# Altium schematic symbol library Diodes - TVS.SchLib: 5379 symbols (part 5 of 35) (continued)
## 824541331 (continued)
TVS DIODE 33V 53.3V DO214AB; Manufacturer: Würth Elektronik; Bidirectional Channels: 1; Current - Peak Pulse (10/1000µs): 28.2A; Power Line Protection: No; Power - Peak Pulse: 1500W (1.5kW); Type: Zener; Voltage - Breakdown (Min): 38.65V (Typ); Voltage - Reverse Standoff (Typ): 33V (Max); Part Number: 824541331; Applications: General Purpose; ComponentLink1Description: Datasheet; ComponentLink1URL: https://katalog.we-online.de/pbs/datasheet/824541331.pdf; ComponentLink2Description: DigiKey Link; ComponentLink2URL: http://digikey.com/product-detail/en/w-rth-elektronik/824541331/732-9819-1-ND/5870973; LastUpdated: 9/2/2020 1:28:05 AM; Lifecycle Status: Active; Minimum Order: 0; Mounting Type: Surface Mount; Operating Temperature: -65°C ~ 150°C (TJ); Package / Case: DO-214AB, SMC; Packaging: TapeAndReel; PartId: 8278; Part Status: Active; Price: 0.60; Series: WE-TVSP; Supplier 1: DigiKey; Supplier Part Number 1: 732-9819-1-ND; Supplier Device Package: DO-214AB; Voltage - Clamping (Max) @ Ipp: 53.3V
footprint DO214AB SMC
pins: 1, 2

## 824541442
designator D?
WE-TVSP POWER TVS DIODE; Manufacturer: Würth Elektronik; Bidirectional Channels: 1; Current - Peak Pulse (10/1000µs): 2.1A; Power Line Protection: No; Type: Zener; Voltage - Breakdown (Min): 517.5V; Voltage - Clamping (Max) @ Ipp: 713V; Voltage - Reverse Standoff (Typ): 440V (Max); Part Number: 824541442; Applications: General Purpose; ComponentLink2Description: DigiKey Link; ComponentLink2URL: http://digikey.com/product-detail/en/würth-elektronik/824541442/732-824541442CT-ND/12727221; LastUpdated: 8/30/2020 9:07:32 PM; Lifecycle Status: Active; Minimum Order: 1; Mounting Type: Surface Mount; Package / Case: DO-214AB, SMC; Packaging: TapeAndReel; PartId: 11481; Price: 1.35; Series: WE-TVSP; Supplier 1: DigiKey; Supplier Part Number 1: 732-824541442CT-ND; Supplier Device Package: DO-214AB
footprint DO214AB SMC
pins: 1, 2

## 824550241
designator D?
TVS DIODE 24V 38.9V DO214AB; Manufacturer: Würth Elektronik; Current - Peak Pulse (10/1000µs): 77.1A; Power Line Protection: No; Power - Peak Pulse: 3000W (3kW); Type: Zener; Unidirectional Channels: 1; Voltage - Breakdown (Min): 28.1V (Typ); Voltage - Reverse Standoff (Typ): 24V (Max); Part Number: 824550241; Applications: General Purpose; ComponentLink1Description: Datasheet; ComponentLink1URL: https://katalog.we-online.de/pbs/datasheet/824550241.pdf; ComponentLink2Description: DigiKey Link; ComponentLink2URL: http://digikey.com/product-detail/en/w-rth-elektronik/824550241/732-9921-1-ND/5871075; LastUpdated: 9/2/2020 1:19:58 AM; Lifecycle Status: Active; Minimum Order: 1; Mounting Type: Surface Mount; Operating Temperature: -65°C ~ 150°C (TJ); Package / Case: DO-214AB, SMC; Packaging: TapeAndReel; PartId: 6238; Part Status: Active; Price: 1.17; Series: WE-TVSP; Supplier 1: DigiKey; Supplier Part Number 1: 732-9921-1-ND; Supplier Device Package: DO-214AB; Voltage - Clamping (Max) @ Ipp: 38.9V
footprint DO214AB SMC
pins: 1, 2

## 824550281
designator D?
TVS DIODE 28V 45.4V DO214AB; Manufacturer: Würth Elektronik; Current - Peak Pulse (10/1000µs): 66.1A; Power Line Protection: No; Power - Peak Pulse: 3000W (3kW); Type: Zener; Unidirectional Channels: 1; Voltage - Breakdown (Min): 32.75V (Typ); Voltage - Reverse Standoff (Typ): 28V (Max); Part Number: 824550281; Applications: General Purpose; ComponentLink1Description: Datasheet; ComponentLink1URL: https://katalog.we-online.de/pbs/datasheet/824550281.pdf; ComponentLink2Description: DigiKey Link; ComponentLink2URL: http://digikey.com/product-detail/en/w-rth-elektronik/824550281/732-9918-1-ND/5871072; LastUpdated: 9/2/2020 1:19:58 AM; Lifecycle Status: Active; Minimum Order: 1; Mounting Type: Surface Mount; Operating Temperature: -65°C ~ 150°C (TJ); Package / Case: DO-214AB, SMC; Packaging: TapeAndReel; PartId: 6237; Part Status: Active; Price: 1.17; Series: WE-TVSP; Supplier 1: DigiKey; Supplier Part Number 1: 732-9918-1-ND; Supplier Device Package: DO-214AB; Voltage - Clamping (Max) @ Ipp: 45.4V
footprint DO214AB SMC
pins: 1, 2

## 824550331
designator D?
TVS DIODE 33V 53.3V DO214AB; Manufacturer: Würth Elektronik; Current - Peak Pulse (10/1000µs): 56.3A; Power Line Protection: No; Power - Peak Pulse: 3000W (3kW); Type: Zener; Unidirectional Channels: 1; Voltage - Breakdown (Min): 38.65V (Typ); Voltage - Reverse Standoff (Typ): 33V (Max); Part Number: 824550331; Applications: General Purpose; ComponentLink1Description: Datasheet; ComponentLink1URL: https://katalog.we-online.de/pbs/datasheet/824550331.pdf; ComponentLink2Description: DigiKey Link; ComponentLink2URL: http://digikey.com/product-detail/en/w-rth-elektronik/824550331/732-9923-1-ND/5871077; LastUpdated: 9/2/2020 1:19:58 AM; Lifecycle Status: Active; Minimum Order: 1; Mounting Type: Surface Mount; Operating Temperature: -65°C ~ 150°C (TJ); Package / Case: DO-214AB, SMC; Packaging: TapeAndReel; PartId: 6236; Part Status: Active; Price: 1.17; Series: WE-TVSP; Supplier 1: DigiKey; Supplier Part Number 1: 732-9923-1-ND; Supplier Device Package: DO-214AB; Voltage - Clamping (Max) @ Ipp: 53.3V
footprint DO214AB SMC
pins: 1, 2

## 824550581
designator D?
TVS DIODE 58V 93.6V DO214AB; Manufacturer: Würth Elektronik; Current - Peak Pulse (10/1000µs): 32.1A; Power Line Protection: No; Power - Peak Pulse: 3000W (3kW); Type: Zener; Unidirectional Channels: 1; Voltage - Breakdown (Min): 67.8V (Typ); Voltage - Reverse Standoff (Typ): 58V (Max); Part Number: 824550581; Applications: General Purpose; ComponentLink1Description: Datasheet; ComponentLink1URL: https://katalog.we-online.de/pbs/datasheet/824550581.pdf; ComponentLink2Description: DigiKey Link; ComponentLink2URL: http://digikey.com/product-detail/en/w-rth-elektronik/824550581/732-9930-1-ND/5871084; LastUpdated: 9/2/2020 1:20:00 AM; Lifecycle Status: Active; Minimum Order: 1; Mounting Type: Surface Mount; Operating Temperature: -65°C ~ 150°C (TJ); Package / Case: DO-214AB, SMC; Packaging: TapeAndReel; PartId: 6429; Part Status: Active; Price: 1.17; Series: WE-TVSP; Supplier 1: DigiKey; Supplier Part Number 1: 732-9930-1-ND; Supplier Device Package: DO-214AB; Voltage - Clamping (Max) @ Ipp: 93.6V
footprint DO214AB SMC
pins: 1, 2

## 824551102
designator D?
TVS DIODE 100V 162V DO214AB; Manufacturer: Würth Elektronik; Bidirectional Channels: 1; Current - Peak Pulse (10/1000µs): 18.5A; Power Line Protection: No; Power - Peak Pulse: 3000W (3kW); Type: Zener; Voltage - Breakdown (Min): 117V (Typ); Voltage - Reverse Standoff (Typ): 100V (Max); Part Number: 824551102; Applications: General Purpose; ComponentLink1Description: Datasheet; ComponentLink1URL: https://katalog.we-online.de/pbs/datasheet/824551102.pdf; ComponentLink2Description: DigiKey Link; ComponentLink2URL: http://digikey.com/product-detail/en/w-rth-elektronik/824551102/732-9903-1-ND/5871057; LastUpdated: 9/2/2020 1:28:01 AM; Lifecycle Status: Active; Minimum Order: 1; Mounting Type: Surface Mount; Operating Temperature: -65°C ~ 150°C (TJ); Package / Case: DO-214AB, SMC; Packaging: TapeAndReel; PartId: 7898; Part Status: Active; Price: 1.17; Series: WE-TVSP; Supplier 1: DigiKey; Supplier Part Number 1: 732-9903-1-ND; Supplier Device Package: DO-214AB; Voltage - Clamping (Max) @ Ipp: 162V
footprint DO214AB SMC
pins: 1, 2

## 824551121
designator D?
TVS DIODE 12V 19.9V DO214AB; Manufacturer: Würth Elektronik; Bidirectional Channels: 1; Current - Peak Pulse (10/1000µs): 150.8A; Power Line Protection: No; Power - Peak Pulse: 3000W (3kW); Type: Zener; Voltage - Breakdown (Min): 14V (Typ); Voltage - Reverse Standoff (Typ): 12V (Max); Part Number: 824551121; Applications: General Purpose; ComponentLink1Description: Datasheet; ComponentLink1URL: https://katalog.we-online.de/pbs/datasheet/824551121.pdf; ComponentLink2Description: DigiKey Link; ComponentLink2URL: http://digikey.com/product-detail/en/w-rth-elektronik/824551121/732-9879-1-ND/5871033; LastUpdated: 9/2/2020 1:28:01 AM; Lifecycle Status: Active; Minimum Order: 1; Mounting Type: Surface Mount; Operating Temperature: -65°C ~ 150°C (TJ); Package / Case: DO-214AB, SMC; Packaging: TapeAndReel; PartId: 7896; Part Status: Active; Price: 1.17; Series: WE-TVSP; Supplier 1: DigiKey; Supplier Part Number 1: 732-9879-1-ND; Supplier Device Package: DO-214AB; Voltage - Clamping (Max) @ Ipp: 19.9V
footprint DO214AB SMC
pins: 1, 2

## 824551162
designator D?
WE-TVSP POWER TVS DIODE; Manufacturer: Würth Elektronik; Bidirectional Channels: 1; Current - Peak Pulse (10/1000µs): 11.6A; Power Line Protection: No; Type: Zener; Voltage - Breakdown (Min): 187.5V; Voltage - Clamping (Max) @ Ipp: 259V; Voltage - Reverse Standoff (Typ): 160V (Max); Part Number: 824551162; Applications: General Purpose; ComponentLink2Description: DigiKey Link; ComponentLink2URL: http://digikey.com/product-detail/en/würth-elektronik/824551162/732-824551162CT-ND/12726826; LastUpdated: 8/30/2020 9:07:32 PM; Lifecycle Status: Active; Minimum Order: 1; Mounting Type: Surface Mount; Package / Case: DO-214AB, SMC; Packaging: CutTape; PartId: 11476; Price: 1.70; Series: WE-TVSP; Supplier 1: DigiKey; Supplier Part Number 1: 732-824551162CT-ND; Supplier Device Package: DO-214AB
footprint DO214AB SMC
pins: 1, 2

## 824551202
designator D?
WE-TVSP POWER TVS DIODE; Manufacturer: Würth Elektronik; Bidirectional Channels: 1; Current - Peak Pulse (10/1000µs): 9.3A; Power Line Protection: No; Type: Zener; Voltage - Breakdown (Min): 235.5V; Voltage - Clamping (Max) @ Ipp: 324V; Voltage - Reverse Standoff (Typ): 200V (Max); Part Number: 824551202; Applications: General Purpose; ComponentLink2Description: DigiKey Link; ComponentLink2URL: http://digikey.com/product-detail/en/würth-elektronik/824551202/732-824551202CT-ND/12727780; LastUpdated: 8/30/2020 9:07:32 PM; Lifecycle Status: Active; Minimum Order: 1; Mounting Type: Surface Mount; Package / Case: DO-214AB, SMC; Packaging: TapeAndReel; PartId: 11480; Price: 1.36; Series: WE-TVSP; Supplier 1: DigiKey; Supplier Part Number 1: 732-824551202CT-ND; Supplier Device Package: DO-214AB
footprint DO214AB SMC
pins: 1, 2

## 824551222
designator D?
WE-TVSP POWER TVS DIODE; Manufacturer: Würth Elektronik; Bidirectional Channels: 1; Current - Peak Pulse (10/1000µs): 8.4A; Power Line Protection: No; Type: Zener; Voltage - Breakdown (Min): 259V; Voltage - Clamping (Max) @ Ipp: 356V; Voltage - Reverse Standoff (Typ): 220V (Max); Part Number: 824551222; Applications: General Purpose; ComponentLink2Description: DigiKey Link; ComponentLink2URL: http://digikey.com/product-detail/en/würth-elektronik/824551222/732-824551222CT-ND/12726876; LastUpdated: 8/30/2020 9:07:32 PM; Lifecycle Status: Active; Minimum Order: 1; Mounting Type: Surface Mount; Package / Case: DO-214AB, SMC; Packaging: TapeAndReel; PartId: 11479; Price: 1.39; Series: WE-TVSP; Supplier 1: DigiKey; Supplier Part Number 1: 732-824551222CT-ND; Supplier Device Package: DO-214AB
footprint DO214AB SMC
pins: 1, 2

## 824551241
designator D?
TVS DIODE 24V 38.9V DO214AB; Manufacturer: Würth Elektronik; Bidirectional Channels: 1; Current - Peak Pulse (10/1000µs): 77.1A; Power Line Protection: No; Power - Peak Pulse: 3000W (3kW); Type: Zener; Voltage - Breakdown (Min): 28.1V (Typ); Voltage - Reverse Standoff (Typ): 24V (Max); Part Number: 824551241; Applications: General Purpose; ComponentLink1Description: Datasheet; ComponentLink1URL: https://katalog.we-online.de/pbs/datasheet/824551241.pdf; ComponentLink2Description: DigiKey Link; ComponentLink2URL: http://digikey.com/product-detail/en/w-rth-elektronik/824551241/732-9886-1-ND/5871040; LastUpdated: 9/2/2020 1:28:01 AM; Lifecycle Status: Active; Minimum Order: 1; Mounting Type: Surface Mount; Operating Temperature: -65°C ~ 150°C (TJ); Package / Case: DO-214AB, SMC; Packaging: TapeAndReel; PartId: 7895; Part Status: Active; Price: 1.17; Series: WE-TVSP; Supplier 1: DigiKey; Supplier Part Number 1: 732-9886-1-ND; Supplier Device Package: DO-214AB; Voltage - Clamping (Max) @ Ipp: 38.9V
footprint DO214AB SMC
pins: 1, 2

## 824551261
designator D?
TVS DIODE 26V 42.1V DO214AB; Manufacturer: Würth Elektronik; Bidirectional Channels: 1; Current - Peak Pulse (10/1000µs): 71.3A; Power Line Protection: No; Power - Peak Pulse: 3000W (3kW); Type: Zener; Voltage - Breakdown (Min): 30.4V (Typ); Voltage - Reverse Standoff (Typ): 26V (Max); Part Number: 824551261; Applications: General Purpose; ComponentLink1Description: Datasheet; ComponentLink1URL: https://katalog.we-online.de/pbs/datasheet/824551261.pdf; ComponentLink2Description: DigiKey Link; ComponentLink2URL: http://digikey.com/product-detail/en/w-rth-elektronik/824551261/732-9882-1-ND/5871036; LastUpdated: 9/2/2020 1:28:06 AM; Lifecycle Status: Active; Minimum Order: 0; Mounting Type: Surface Mount; Operating Temperature: -65°C ~ 150°C (TJ); Package / Case: DO-214AB, SMC; Packaging: TapeAndReel; PartId: 8490; Part Status: Active; Price: 1.17; Series: WE-TVSP; Supplier 1: DigiKey; Supplier Part Number 1: 732-9882-1-ND; Supplier Device Package: DO-214AB; Voltage - Clamping (Max) @ Ipp: 42.1V
footprint DO214AB SMC
pins: 1, 2

## 824551281
designator D?
TVS DIODE 28V 45.4V DO214AB; Manufacturer: Würth Elektronik; Bidirectional Channels: 1; Current - Peak Pulse (10/1000µs): 66.1A; Power Line Protection: No; Power - Peak Pulse: 3000W (3kW); Type: Zener; Voltage - Breakdown (Min): 32.75V (Typ); Voltage - Reverse Standoff (Typ): 28V (Max); Part Number: 824551281; Applications: General Purpose; ComponentLink1Description: Datasheet; ComponentLink1URL: https://katalog.we-online.de/pbs/datasheet/824551281.pdf; ComponentLink2Description: DigiKey Link; ComponentLink2URL: http://digikey.com/product-detail/en/w-rth-elektronik/824551281/732-9883-1-ND/5871037; LastUpdated: 9/2/2020 1:28:01 AM; Lifecycle Status: Active; Minimum Order: 0; Mounting Type: Surface Mount; Operating Temperature: -65°C ~ 150°C (TJ); Package / Case: DO-214AB, SMC; Packaging: TapeAndReel; PartId: 7900; Part Status: Active; Price: 1.17; Series: WE-TVSP; Supplier 1: DigiKey; Supplier Part Number 1: 732-9883-1-ND; Supplier Device Package: DO-214AB; Voltage - Clamping (Max) @ Ipp: 45.4V
footprint DO214AB SMC
pins: 1, 2

## 824551301
designator D?
TVS DIODE 30V 48.4V DO214AB; Manufacturer: Würth Elektronik; Bidirectional Channels: 1; Current - Peak Pulse (10/1000µs): 62A; Power Line Protection: No; Power - Peak Pulse: 3000W (3kW); Type: Zener; Voltage - Breakdown (Min): 35.05V (Typ); Voltage - Reverse Standoff (Typ): 30V (Max); Part Number: 824551301; Applications: General Purpose; ComponentLink1Description: Datasheet; ComponentLink1URL: https://katalog.we-online.de/pbs/datasheet/824551301.pdf; ComponentLink2Description: DigiKey Link; ComponentLink2URL: http://digikey.com/product-detail/en/w-rth-elektronik/824551301/732-9888-1-ND/5871042; LastUpdated: 9/2/2020 1:28:01 AM; Lifecycle Status: Active; Minimum Order: 0; Mounting Type: Surface Mount; Operating Temperature: -65°C ~ 150°C (TJ); Package / Case: DO-214AB, SMC; Packaging: TapeAndReel; PartId: 7899; Part Status: Active; Price: 1.17; Series: WE-TVSP; Supplier 1: DigiKey; Supplier Part Number 1: 732-9888-1-ND; Supplier Device Package: DO-214AB; Voltage - Clamping (Max) @ Ipp: 48.4V
footprint DO214AB SMC
pins: 1, 2

## 824551331
designator D?
TVS DIODE 33V 53.3V DO214AB; Manufacturer: Würth Elektronik; Bidirectional Channels: 1; Current - Peak Pulse (10/1000µs): 56.3A; Power Line Protection: No; Power - Peak Pulse: 3000W (3kW); Type: Zener; Voltage - Breakdown (Min): 38.65V (Typ); Voltage - Reverse Standoff (Typ): 33V (Max); Part Number: 824551331; Applications: General Purpose; ComponentLink1Description: Datasheet; ComponentLink1URL: https://katalog.we-online.de/pbs/datasheet/824551331.pdf; ComponentLink2Description: DigiKey Link; ComponentLink2URL: http://digikey.com/product-detail/en/w-rth-elektronik/824551331/732-9889-1-ND/5871043; LastUpdated: 9/2/2020 1:28:01 AM; Lifecycle Status: Active; Minimum Order: 1; Mounting Type: Surface Mount; Operating Temperature: -65°C ~ 150°C (TJ); Package / Case: DO-214AB, SMC; Packaging: TapeAndReel; PartId: 7897; Part Status: Active; Price: 1.17; Series: WE-TVSP; Supplier 1: DigiKey; Supplier Part Number 1: 732-9889-1-ND; Supplier Device Package: DO-214AB; Voltage - Clamping (Max) @ Ipp: 53.3V
footprint DO214AB SMC
pins: 1, 2

## 824551361
designator D?
TVS DIODE 36V 58.1V DO214AB; Manufacturer: Würth Elektronik; Bidirectional Channels: 1; Current - Peak Pulse (10/1000µs): 51.6A; Power Line Protection: No; Power - Peak Pulse: 3000W (3kW); Type: Zener; Voltage - Breakdown (Min): 42.1V (Typ); Voltage - Reverse Standoff (Typ): 36V (Max); Part Number: 824551361; Applications: General Purpose; ComponentLink1Description: Datasheet; ComponentLink1URL: https://katalog.we-online.de/pbs/datasheet/824551361.pdf; ComponentLink2Description: DigiKey Link; ComponentLink2URL: http://digikey.com/product-detail/en/w-rth-elektronik/824551361/732-9887-1-ND/5871041; LastUpdated: 9/2/2020 1:28:06 AM; Lifecycle Status: Active; Minimum Order: 1; Mounting Type: Surface Mount; Operating Temperature: -65°C ~ 150°C (TJ); Package / Case: DO-214AB, SMC; Packaging: TapeAndReel; PartId: 8486; Part Status: Active; Price: 1.17; Series: WE-TVSP; Supplier 1: DigiKey; Supplier Part Number 1: 732-9887-1-ND; Supplier Device Package: DO-214AB; Voltage - Clamping (Max) @ Ipp: 58.1V
footprint DO214AB SMC
pins: 1, 2

## ACPDQC3V3R-HF
designator D?
ESD DIODE 3.3VWM 18VC 0402 SOD-9; Manufacturer: Comchip Technology; Bidirectional Channels: 1; Capacitance @ Frequency: 18pF @ 1MHz; Current - Peak Pulse (10/1000µs): 2A (8/20µs); Power Line Protection: No; Power - Peak Pulse: 36W; Type: Zener; Voltage - Breakdown (Min): 5V; Voltage - Clamping (Max) @ Ipp: 18V; Voltage - Reverse Standoff (Typ): 3.3V (Max); Part Number: ACPDQC3V3R-HF; Applications: Automotive; ComponentLink1Description: Datasheet; ComponentLink1URL: http://www.comchiptech.com/admin/files/product/12025_20190315100524.pdf; ComponentLink2Description: DigiKey Link; ComponentLink2URL: http://digikey.com/product-detail/en/comchip-technology/ACPDQC3V3R-HF/641-2045-1-ND/10106896; Device Package: 0402 (1006 Metric); LastUpdated: 9/2/2020 1:28:49 AM; Lifecycle Status: Active; Minimum Order: 1; Mounting Type: Surface Mount; Operating Temperature: -55°C ~ 150°C (TJ); Package / Case: 0402 (1006 Metric); Packaging: TapeAndReel; PartId: 10484; Part Status: Active; Price: 0.05; Series: Automotive, AEC-Q101; Supplier 1: DigiKey; Supplier Part Number 1: 641-2045-1-ND; Supplier Device Package: 0402C/SOD-923F
footprint 0402
pins: 1, 2

## ACPDQC3V3T-HF
designator D?
TVS DIODE 3.3V 9.8V 0402C; Manufacturer: Comchip Technology; Bidirectional Channels: 1; Capacitance @ Frequency: 20pF @ 1MHz; Current - Peak Pulse (10/1000µs): 16A (8/20µs); Power Line Protection: No; Type: Zener; Voltage - Breakdown (Min): 3.6V; Voltage - Reverse Standoff (Typ): 3.3V (Max); Part Number: ACPDQC3V3T-HF; Applications: Automotive; ComponentLink1Description: Datasheet; ComponentLink1URL: http://www.comchiptech.com/admin/files/product/ACPDQC3V3T-HF%20RevA660763.pdf; ComponentLink2Description: DigiKey Link; ComponentLink2URL: http://digikey.com/product-detail/en/comchip-technology/ACPDQC3V3T-HF/641-1635-1-ND/5013840; Device Package: 0402 (1005 Metric); LastUpdated: 9/2/2020 1:28:49 AM; Lifecycle Status: Active; Minimum Order: 1; Mounting Type: Surface Mount; Package / Case: 0402 (1005 Metric); Packaging: TapeAndReel; PartId: 10466; Part Status: Active; Price: 0.06; Series: Automotive, AEC-Q101; Supplier 1: DigiKey; Supplier Part Number 1: 641-1635-1-ND; Supplier Device Package: 0402C/SOD-923F; Voltage - Clamping (Max) @ Ipp: 9.8V
footprint 0402
pins: 1, 2

## ACPDQC5V0CSP-HF
designator D?
TVS DIODE 5V 20V 0402C/SOD923F; Manufacturer: Comchip Technology; Bidirectional Channels: 1; Capacitance @ Frequency: 0.3pF @ 1MHz; Current - Peak Pulse (10/1000µs): 3A (8/20µs); Power Line Protection: No; Power - Peak Pulse: 60W; Type: Zener; Voltage - Breakdown (Min): 6V; Voltage - Reverse Standoff (Typ): 5V (Max); Part Number: ACPDQC5V0CSP-HF; Applications: Automotive; ComponentLink1Description: Datasheet; ComponentLink1URL: http://www.comchiptech.com/admin/files/product/ACPDQC5V0CSP-HF%20RevA449708.pdf; ComponentLink2Description: DigiKey Link; ComponentLink2URL: http://digikey.com/product-detail/en/comchip-technology/ACPDQC5V0CSP-HF/641-1783-1-ND/6138947; Device Package: 0402 (1006 Metric); LastUpdated: 9/2/2020 1:28:49 AM; Lifecycle Status: Active; Minimum Order: 1; Mounting Type: Surface Mount; Operating Temperature: -55°C ~ 150°C (TJ); Package / Case: 0402 (1006 Metric); Packaging: TapeAndReel; PartId: 10461; Part Status: Active; Price: 0.08; Series: Automotive, AEC-Q101; Supplier 1: DigiKey; Supplier Part Number 1: 641-1783-1-ND; Supplier Device Package: 0402/SOD-923F; Voltage - Clamping (Max) @ Ipp: 20V
footprint 0402
pins: 1, 2

## ACPDQC5V0CSP-IPHF
designator D?
ESD DIODE 5VWM 19VC BI-DIR 0402; Manufacturer: Comchip Technology; Bidirectional Channels: 1; Capacitance @ Frequency: 0.15pF @ 1MHz; Current - Peak Pulse (10/1000µs): 2A (8/20µs); Power Line Protection: No; Power - Peak Pulse: 38W; Type: Zener; Voltage - Breakdown (Min): 7V; Voltage - Clamping (Max) @ Ipp: 19V; Voltage - Reverse Standoff (Typ): 5V (Max); Part Number: ACPDQC5V0CSP-IPHF; Applications: Automotive; ComponentLink1Description: Datasheet; ComponentLink1URL: http://www.comchiptech.com/admin/files/product/ACPDQC5V0CSP-IPHF%20RevA.PDF; ComponentLink2Description: DigiKey Link; ComponentLink2URL: http://digikey.com/product-detail/en/comchip-technology/ACPDQC5V0CSP-IPHF/641-2058-1-ND/10106909; Device Package: 0402 (1006 Metric); LastUpdated: 9/2/2020 1:28:49 AM; Lifecycle Status: Active; Minimum Order: 1; Mounting Type: Surface Mount; Operating Temperature: -55°C ~ 150°C (TJ); Package / Case: 0402 (1006 Metric); Packaging: TapeAndReel; PartId: 10455; Part Status: Active; Price: 0.09; Series: Automotive, AEC-Q101; Supplier 1: DigiKey; Supplier Part Number 1: 641-2058-1-ND; Supplier Device Package: 0402C/SOD-923F
footprint 0402
pins: 1, 2

## ACPDQC5V0ESPC-HF
designator D?
ESD DIODE 5VWM 25VC BI-DIR 0402; Manufacturer: Comchip Technology; Bidirectional Channels: 1; Capacitance @ Frequency: 0.28pF @ 1MHz; Current - Peak Pulse (10/1000µs): 4A (8/20µs); Power Line Protection: No; Power - Peak Pulse: 100W; Type: Zener; Voltage - Breakdown (Min): 7V; Voltage - Clamping (Max) @ Ipp: 35V (Typ); Voltage - Reverse Standoff (Typ): 5V (Max); Part Number: ACPDQC5V0ESPC-HF; Applications: Automotive; ComponentLink1Description: Datasheet; ComponentLink1URL: http://www.comchiptech.com/admin/files/product/ACPDQC5V0ESPC-HF%20RevA925610.pdf; ComponentLink2Description: DigiKey Link; ComponentLink2URL: http://digikey.com/product-detail/en/comchip-technology/ACPDQC5V0ESPC-HF/641-2059-1-ND/10106910; Device Package: 0402 (1006 Metric); LastUpdated: 9/2/2020 1:28:48 AM; Lifecycle Status: Active; Minimum Order: 1; Mounting Type: Surface Mount; Operating Temperature: -40°C ~ 125°C (TJ); Package / Case: 0402 (1006 Metric); Packaging: TapeAndReel; PartId: 10430; Part Status: Active; Price: 0.08; Series: Automotive, AEC-Q101; Supplier 1: DigiKey; Supplier Part Number 1: 641-2059-1-ND; Supplier Device Package: 0402C/SOD-923F
footprint 0402
pins: 1, 2

## ACPDQC5V0R-HF
designator D?
TVS DIODE 5V 12V 0402C/SOD923F; Manufacturer: Comchip Technology; Bidirectional Channels: 1; Capacitance @ Frequency: 24pF @ 1MHz; Current - Peak Pulse (10/1000µs): 11A (8/20µs); Power Line Protection: No; Type: Zener; Voltage - Breakdown (Min): 5.6V; Voltage - Reverse Standoff (Typ): 5V (Max); Part Number: ACPDQC5V0R-HF; Applications: Automotive; ComponentLink1Description: Datasheet; ComponentLink1URL: http://www.comchiptech.com/admin/files/product/ACPDxx5V0R-HF%20Series%20RevB661222.pdf; ComponentLink2Description: DigiKey Link; ComponentLink2URL: http://digikey.com/product-detail/en/comchip-technology/ACPDQC5V0R-HF/641-1636-1-ND/5013841; Device Package: 0402 (1005 Metric); LastUpdated: 9/2/2020 1:28:49 AM; Lifecycle Status: Active; Minimum Order: 1; Mounting Type: Surface Mount; Operating Temperature: -40°C ~ 150°C (TJ); Package / Case: 0402 (1005 Metric); Packaging: TapeAndReel; PartId: 10494; Part Status: Active; Price: 0.06; Series: Automotive, AEC-Q101; Supplier 1: DigiKey; Supplier Part Number 1: 641-1636-1-ND; Supplier Device Package: 0402C/SOD-923F; Voltage - Clamping (Max) @ Ipp: 12V
footprint 0402
pins: 1, 2

## ACPDQC5V0USP-IPHF
designator D?
ESD DIODE 5VWM 15VC 0402 SOD-923; Manufacturer: Comchip Technology; Capacitance @ Frequency: 0.3pF @ 1MHz; Current - Peak Pulse (10/1000µs): 2A (8/20µs); Power Line Protection: No; Power - Peak Pulse: 30W; Type: Zener; Unidirectional Channels: 1; Voltage - Breakdown (Min): 6V; Voltage - Clamping (Max) @ Ipp: 15V; Voltage - Reverse Standoff (Typ): 5V (Max); Part Number: ACPDQC5V0USP-IPHF; Applications: Automotive; ComponentLink1Description: Datasheet; ComponentLink1URL: http://www.comchiptech.com/admin/files/product/12015_20190312162617.PDF; ComponentLink2Description: DigiKey Link; ComponentLink2URL: http://digikey.com/product-detail/en/comchip-technology/ACPDQC5V0USP-IPHF/641-2048-1-ND/10106899; Device Package: 0402 (1006 Metric); LastUpdated: 9/2/2020 1:28:45 AM; Lifecycle Status: Active; Minimum Order: 1; Mounting Type: Surface Mount; Operating Temperature: -55°C ~ 150°C (TJ); Package / Case: 0402 (1006 Metric); Packaging: TapeAndReel; PartId: 10390; Part Status: Active; Price: 0.07; Series: Automotive, AEC-Q101; Supplier 1: DigiKey; Supplier Part Number 1: 641-2048-1-ND; Supplier Device Package: 0402C/SOD-923F
footprint 0402
pins: 1, 2

## ACPDQC12V-HF
designator D?
ESD DIODE 12VWM 25VC BI-DIR 0402; Manufacturer: Comchip Technology; Bidirectional Channels: 1; Capacitance @ Frequency: 12pF @ 1MHz; Current - Peak Pulse (10/1000µs): 1A (8/20µs); Power Line Protection: No; Power - Peak Pulse: 25W; Type: Zener; Voltage - Breakdown (Min): 13V; Voltage - Clamping (Max) @ Ipp: 25V; Voltage - Reverse Standoff (Typ): 12V (Max); Part Number: ACPDQC12V-HF; Applications: Automotive; ComponentLink1Description: Datasheet; ComponentLink1URL: http://www.comchiptech.com/admin/files/product/12027_20190315101536.pdf; ComponentLink2Description: DigiKey Link; ComponentLink2URL: http://digikey.com/product-detail/en/comchip-technology/ACPDQC12V-HF/641-2050-1-ND/10106901; Device Package: 0402 (1006 Metric); LastUpdated: 9/2/2020 1:28:49 AM; Lifecycle Status: Active; Minimum Order: 1; Mounting Type: Surface Mount; Operating Temperature: -40°C ~ 125°C (TJ); Package / Case: 0402 (1006 Metric); Packaging: TapeAndReel; PartId: 10478; Part Status: Active; Price: 0.08; Series: Automotive, AEC-Q101; Supplier 1: DigiKey; Supplier Part Number 1: 641-2050-1-ND; Supplier Device Package: 0402C/SOD-923F
footprint 0402
pins: 1, 2

## ACPDQC12VEU-HF
designator D?
ESD DIODE 12VWM 22VC 0402 SOD-92; Manufacturer: Comchip Technology; Capacitance @ Frequency: 60pF @ 1MHz (Max); Current - Peak Pulse (10/1000µs): 5A (8/20µs); Power Line Protection: No; Power - Peak Pulse: 110W; Type: Zener; Unidirectional Channels: 1; Voltage - Breakdown (Min): 13.5V; Voltage - Clamping (Max) @ Ipp: 22V; Voltage - Reverse Standoff (Typ): 12V (Max); Part Number: ACPDQC12VEU-HF; Applications: Automotive; ComponentLink1Description: Datasheet; ComponentLink1URL: http://www.comchiptech.com/admin/files/product/12014_20190312162309.PDF; ComponentLink2Description: DigiKey Link; ComponentLink2URL: http://digikey.com/product-detail/en/comchip-technology/ACPDQC12VEU-HF/641-2051-1-ND/10106902; Device Package: 0402 (1006 Metric); LastUpdated: 9/2/2020 1:28:45 AM; Lifecycle Status: Active; Minimum Order: 1; Mounting Type: Surface Mount; Operating Temperature: -55°C ~ 125°C (TJ); Package / Case: 0402 (1006 Metric); Packaging: TapeAndReel; PartId: 10371; Part Status: Active; Price: 0.04; Series: Automotive, AEC-Q101; Supplier 1: DigiKey; Supplier Part Number 1: 641-2051-1-ND; Supplier Device Package: 0402C/SOD-923F
footprint 0402
pins: 1, 2

## ACPDQC24VE-HF
designator D?
TVS DIODE 24V 44V 0402C/SOD923F; Manufacturer: Comchip Technology; Bidirectional Channels: 1; Capacitance @ Frequency: 16pF @ 1MHz; Current - Peak Pulse (10/1000µs): 2.5A (8/20µs); Power Line Protection: No; Power - Peak Pulse: 110W; Type: Zener; Voltage - Breakdown (Min): 26.5V; Voltage - Reverse Standoff (Typ): 24V (Max); Part Number: ACPDQC24VE-HF; Applications: Automotive; ComponentLink1Description: Datasheet; ComponentLink1URL: http://www.comchiptech.com/admin/files/product/ACPDQC24VE-HF%20RevA727899.pdf; ComponentLink2Description: DigiKey Link; ComponentLink2URL: http://digikey.com/product-detail/en/comchip-technology/ACPDQC24VE-HF/641-1883-1-ND/7100781; Device Package: 0402 (1006 Metric); LastUpdated: 9/2/2020 1:28:49 AM; Lifecycle Status: Active; Minimum Order: 1; Mounting Type: Surface Mount; Operating Temperature: -55°C ~ 125°C (TJ); Package / Case: 0402 (1006 Metric); Packaging: TapeAndReel; PartId: 10453; Part Status: Active; Price: 0.07; Series: Automotive, AEC-Q101; Supplier 1: DigiKey; Supplier Part Number 1: 641-1883-1-ND; Supplier Device Package: 0402C/SOD-923F; Voltage - Clamping (Max) @ Ipp: 44V
footprint 0402
pins: 1, 2

## AOZ8131DI-05L
designator D?
TVS DIODE 5V 22V 2DFN; Manufacturer: Alpha & Omega Semiconductor Inc.; Bidirectional Channels: 1; Capacitance @ Frequency: 1.25pF @ 1MHz; Current - Peak Pulse (10/1000µs): 4A (8/20µs); Power Line Protection: No; Type: Zener; Voltage - Breakdown (Min): 6V; Voltage - Reverse Standoff (Typ): 5V (Max); Part Number: AOZ8131DI-05L; Applications: General Purpose; ComponentLink1Description: Datasheet; ComponentLink1URL: http://aosmd.com/res/data_sheets/AOZ8131DI.pdf; ComponentLink2Description: DigiKey Link; ComponentLink2URL: http://digikey.com/product-detail/en/alpha-omega-semiconductor-inc/AOZ8131DI-05L/785-1645-1-ND/4484981; Device Package: 0402 (1006 Metric); LastUpdated: 9/2/2020 1:28:49 AM; Lifecycle Status: Active; Minimum Order: 1; Mounting Type: Surface Mount; Operating Temperature: -40°C ~ 125°C (TJ); Package / Case: 0402 (1006 Metric); Packaging: TapeAndReel; PartId: 10486; Part Status: Active; Price: 0.09; Series: -; Supplier 1: DigiKey; Supplier Part Number 1: 785-1645-1-ND; Supplier Device Package: 2-DFN (1x0.6); Voltage - Clamping (Max) @ Ipp: 22V
footprint 0402
pins: 1, 2

## AQ05-01FTG
designator D?
TVS DIODE 5V 13V SOD323; Manufacturer: Littelfuse Inc.; Capacitance @ Frequency: 350pF @ 1MHz (Max); Current - Peak Pulse (10/1000µs): 30A (8/20µs); Power Line Protection: No; Power - Peak Pulse: 450W; Type: Zener; Unidirectional Channels: 1; Voltage - Reverse Standoff (Typ): 5V (Max); Part Number: AQ05-01FTG; Applications: Automotive, CAN; ComponentLink1Description: Datasheet; ComponentLink1URL: https://www.littelfuse.com/~/media/electronics/datasheets/tvs_diode_arrays/littelfuse_tvs_diode_array_aqxx_datasheet.pdf.pdf; ComponentLink2Description: DigiKey Link; ComponentLink2URL: http://digikey.com/product-detail/en/littelfuse-inc/AQ05-01FTG/F10384CT-ND/7902212; LastUpdated: 9/2/2020 1:28:27 AM; Lifecycle Status: Active; Minimum Order: 1; Mounting Type: Surface Mount; Operating Temperature: -40°C ~ 150°C (TA); Package / Case: SC-76, SOD-323; Packaging: TapeAndReel; PartId: 9883; Part Status: Active; Price: 0.11; Series: Automotive, AEC-Q101, AQ, SPA®; Supplier 1: DigiKey; Supplier Part Number 1: F10384CT-ND; Supplier Device Package: SOD-323; Voltage - Clamping (Max) @ Ipp: 13V
footprint SOD323
pins: 1, 2

## AQ05C-01FTG
designator D?
TVS DIODE 5V 14.5V SOD323; Manufacturer: Littelfuse Inc.; Bidirectional Channels: 1; Capacitance @ Frequency: 200pF @ 1MHz (Max); Current - Peak Pulse (10/1000µs): 30A (8/20µs); Power Line Protection: No; Power - Peak Pulse: 450W; Type: Zener; Voltage - Reverse Standoff (Typ): 5V (Max); Part Number: AQ05C-01FTG; Applications: Automotive, CAN; ComponentLink1Description: Datasheet; ComponentLink1URL: https://www.littelfuse.com/~/media/electronics/datasheets/tvs_diode_arrays/littelfuse_tvs_diode_array_aqxxc_datasheet.pdf.pdf; ComponentLink2Description: DigiKey Link; ComponentLink2URL: http://digikey.com/product-detail/en/littelfuse-inc/AQ05C-01FTG/F10385CT-ND/7902213; LastUpdated: 9/2/2020 1:28:29 AM; Lifecycle Status: Active; Minimum Order: 1; Mounting Type: Surface Mount; Operating Temperature: -40°C ~ 150°C (TA); Package / Case: SC-76, SOD-323; Packaging: TapeAndReel; PartId: 9968; Part Status: Active; Price: 0.13; Series: Automotive, AEC-Q101, AQ, SPA®; Supplier 1: DigiKey; Supplier Part Number 1: F10385CT-ND; Supplier Device Package: SOD-323; Voltage - Clamping (Max) @ Ipp: 14.5V
footprint SOD323
pins: 1, 2

## AQ12-01FTG
designator D?
TVS DIODE 12V 22.5V SOD323; Manufacturer: Littelfuse Inc.; Capacitance @ Frequency: 150pF @ 1MHz (Max); Current - Peak Pulse (10/1000µs): 17A (8/20µs); Power Line Protection: No; Power - Peak Pulse: 450W; Type: Zener; Unidirectional Channels: 1; Voltage - Reverse Standoff (Typ): 12V (Max); Part Number: AQ12-01FTG; Applications: Automotive, CAN; ComponentLink1Description: Datasheet; ComponentLink1URL: https://www.littelfuse.com/~/media/electronics/datasheets/tvs_diode_arrays/littelfuse_tvs_diode_array_aqxx_datasheet.pdf.pdf; ComponentLink2Description: DigiKey Link; ComponentLink2URL: http://digikey.com/product-detail/en/littelfuse-inc/AQ12-01FTG/F10386CT-ND/7902214; LastUpdated: 9/2/2020 1:28:27 AM; Lifecycle Status: Active; Minimum Order: 1; Mounting Type: Surface Mount; Operating Temperature: -40°C ~ 150°C (TA); Package / Case: SC-76, SOD-323; Packaging: CutTape; PartId: 9897; Part Status: Active; Price: 0.42; Series: Automotive, AEC-Q101, AQ, SPA®; Supplier 1: DigiKey; Supplier Part Number 1: F10386CT-ND; Supplier Device Package: SOD-323; Voltage - Clamping (Max) @ Ipp: 22.5V
footprint SOD323
pins: 1, 2

## AQ12C-01FTG
designator D?
TVS DIODE 12V 23V SOD323; Manufacturer: Littelfuse Inc.; Bidirectional Channels: 1; Capacitance @ Frequency: 100pF @ 1MHz (Max); Current - Peak Pulse (10/1000µs): 17A (8/20µs); Power Line Protection: No; Power - Peak Pulse: 450W; Type: Zener; Voltage - Reverse Standoff (Typ): 12V (Max); Part Number: AQ12C-01FTG; Applications: Automotive, CAN; ComponentLink1Description: Datasheet; ComponentLink1URL: https://www.littelfuse.com/~/media/electronics/datasheets/tvs_diode_arrays/littelfuse_tvs_diode_array_aqxxc_datasheet.pdf.pdf; ComponentLink2Description: DigiKey Link; ComponentLink2URL: http://digikey.com/product-detail/en/littelfuse-inc/AQ12C-01FTG/F10387CT-ND/7902215; LastUpdated: 9/2/2020 1:28:29 AM; Lifecycle Status: Active; Minimum Order: 1; Mounting Type: Surface Mount; Operating Temperature: -40°C ~ 150°C (TA); Package / Case: SC-76, SOD-323; Packaging: TapeAndReel; PartId: 9971; Part Status: Active; Price: 0.13; Series: Automotive, AEC-Q101, AQ, SPA®; Supplier 1: DigiKey; Supplier Part Number 1: F10387CT-ND; Supplier Device Package: SOD-323; Voltage - Clamping (Max) @ Ipp: 23V
footprint SOD323
pins: 1, 2

## AQ15-01FTG
designator D?
TVS DIODE 15V 30V SOD323; Manufacturer: Littelfuse Inc.; Capacitance @ Frequency: 100pF @ 1MHz (Max); Current - Peak Pulse (10/1000µs): 12A (8/20µs); Power Line Protection: No; Power - Peak Pulse: 450W; Type: Zener; Unidirectional Channels: 1; Voltage - Reverse Standoff (Typ): 15V (Max); Part Number: AQ15-01FTG; Applications: Automotive, CAN; ComponentLink1Description: Datasheet; ComponentLink1URL: https://www.littelfuse.com/~/media/electronics/datasheets/tvs_diode_arrays/littelfuse_tvs_diode_array_aqxx_datasheet.pdf.pdf; ComponentLink2Description: DigiKey Link; ComponentLink2URL: http://digikey.com/product-detail/en/littelfuse-inc/AQ15-01FTG/F10388CT-ND/7902216; LastUpdated: 9/2/2020 1:28:27 AM; Lifecycle Status: Active; Minimum Order: 1; Mounting Type: Surface Mount; Operating Temperature: -40°C ~ 150°C (TA); Package / Case: SC-76, SOD-323; Packaging: CutTape; PartId: 9903; Part Status: Active; Price: 0.42; Series: Automotive, AEC-Q101, AQ, SPA®; Supplier 1: DigiKey; Supplier Part Number 1: F10388CT-ND; Supplier Device Package: SOD-323; Voltage - Clamping (Max) @ Ipp: 30V
footprint SOD323
pins: 1, 2

## AQ15C-01FTG
designator D?
TVS DIODE 15V 31V SOD323; Manufacturer: Littelfuse Inc.; Bidirectional Channels: 1; Capacitance @ Frequency: 75pF @ 1MHz (Max); Current - Peak Pulse (10/1000µs): 12A (8/20µs); Power Line Protection: No; Power - Peak Pulse: 450W; Type: Zener; Voltage - Reverse Standoff (Typ): 15V (Max); Part Number: AQ15C-01FTG; Applications: Automotive, CAN; ComponentLink1Description: Datasheet; ComponentLink1URL: https://www.littelfuse.com/~/media/electronics/datasheets/tvs_diode_arrays/littelfuse_tvs_diode_array_aqxxc_datasheet.pdf.pdf; ComponentLink2Description: DigiKey Link; ComponentLink2URL: http://digikey.com/product-detail/en/littelfuse-inc/AQ15C-01FTG/F10389CT-ND/7902217; LastUpdated: 9/2/2020 1:28:29 AM; Lifecycle Status: Active; Minimum Order: 1; Mounting Type: Surface Mount; Operating Temperature: -40°C ~ 150°C (TA); Package / Case: SC-76, SOD-323; Packaging: TapeAndReel; PartId: 9983; Part Status: Active; Price: 0.13; Series: Automotive, AEC-Q101, AQ, SPA®; Supplier 1: DigiKey; Supplier Part Number 1: F10389CT-ND; Supplier Device Package: SOD-323; Voltage - Clamping (Max) @ Ipp: 31V
footprint SOD323
pins: 1, 2

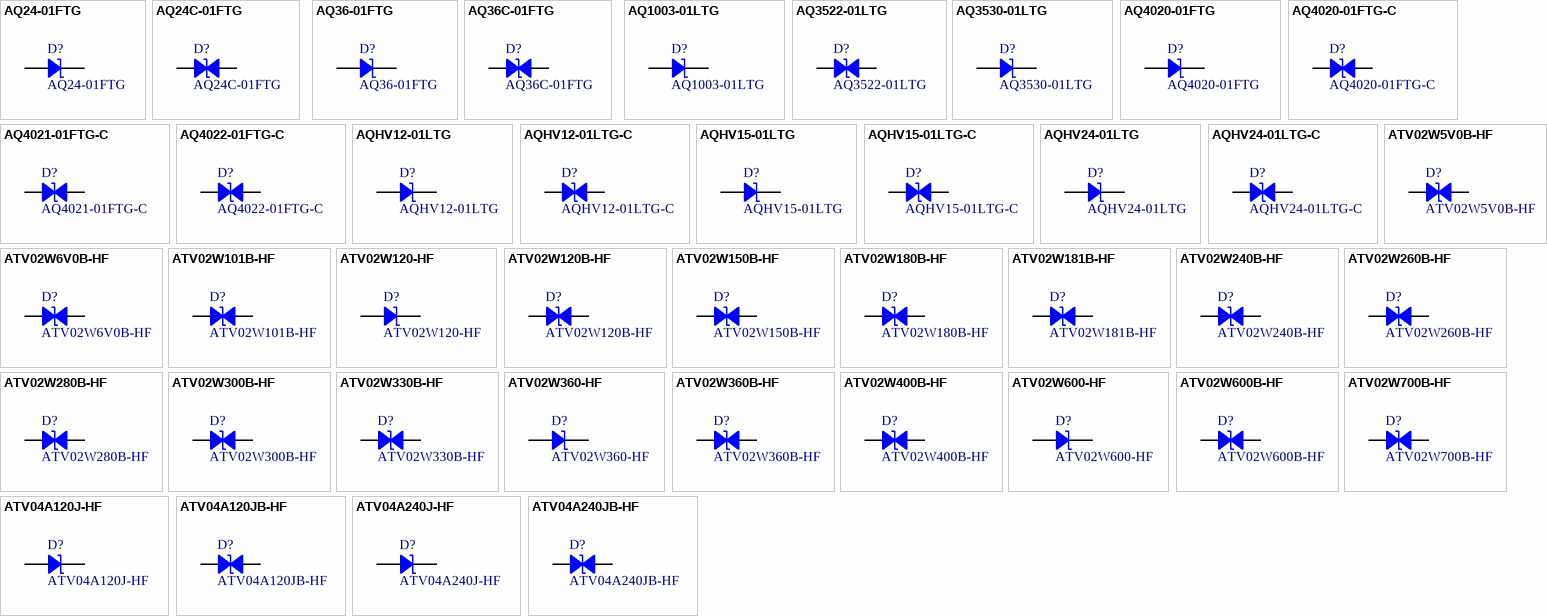
[diagram p18: symbols AQ24-01FTG to ATV04A240JB-HF]

## AQ24-01FTG
designator D?
TVS DIODE 24V 42V SOD323; Manufacturer: Littelfuse Inc.; Capacitance @ Frequency: 65pF @ 1MHz (Max); Current - Peak Pulse (10/1000µs): 7A (8/20µs); Power Line Protection: No; Power - Peak Pulse: 450W; Type: Zener; Unidirectional Channels: 1; Voltage - Reverse Standoff (Typ): 24V (Max); Part Number: AQ24-01FTG; Applications: Automotive, CAN; ComponentLink1Description: Datasheet; ComponentLink1URL: https://www.littelfuse.com/~/media/electronics/datasheets/tvs_diode_arrays/littelfuse_tvs_diode_array_aqxx_datasheet.pdf.pdf; ComponentLink2Description: DigiKey Link; ComponentLink2URL: http://digikey.com/product-detail/en/littelfuse-inc/AQ24-01FTG/F10390CT-ND/7902218; LastUpdated: 9/2/2020 1:28:27 AM; Lifecycle Status: Active; Minimum Order: 1; Mounting Type: Surface Mount; Operating Temperature: -40°C ~ 150°C (TA); Package / Case: SC-76, SOD-323; Packaging: CutTape; PartId: 9896; Part Status: Active; Price: 0.42; Series: Automotive, AEC-Q101, AQ, SPA®; Supplier 1: DigiKey; Supplier Part Number 1: F10390CT-ND; Supplier Device Package: SOD-323; Voltage - Clamping (Max) @ Ipp: 42V
footprint SOD323
pins: 1, 2

## AQ24C-01FTG
designator D?
TVS DIODE 24V 42V SOD323; Manufacturer: Littelfuse Inc.; Bidirectional Channels: 1; Capacitance @ Frequency: 50pF @ 1MHz (Max); Current - Peak Pulse (10/1000µs): 7A (8/20µs); Power Line Protection: No; Power - Peak Pulse: 450W; Type: Zener; Voltage - Reverse Standoff (Typ): 24V (Max); Part Number: AQ24C-01FTG; Applications: Automotive, CAN; ComponentLink1Description: Datasheet; ComponentLink1URL: https://www.littelfuse.com/~/media/electronics/datasheets/tvs_diode_arrays/littelfuse_tvs_diode_array_aqxxc_datasheet.pdf.pdf; ComponentLink2Description: DigiKey Link; ComponentLink2URL: http://digikey.com/product-detail/en/littelfuse-inc/AQ24C-01FTG/F10391CT-ND/7902219; LastUpdated: 9/2/2020 1:28:29 AM; Lifecycle Status: Active; Minimum Order: 1; Mounting Type: Surface Mount; Operating Temperature: -40°C ~ 150°C (TA); Package / Case: SC-76, SOD-323; Packaging: TapeAndReel; PartId: 9967; Part Status: Active; Price: 0.13; Series: Automotive, AEC-Q101, AQ, SPA®; Supplier 1: DigiKey; Supplier Part Number 1: F10391CT-ND; Supplier Device Package: SOD-323; Voltage - Clamping (Max) @ Ipp: 42V
footprint SOD323
pins: 1, 2

## AQ36-01FTG
designator D?
TVS DIODE 36V 62V SOD323; Manufacturer: Littelfuse Inc.; Capacitance @ Frequency: 50pF @ 1MHz (Max); Current - Peak Pulse (10/1000µs): 5A (8/20µs); Power Line Protection: No; Power - Peak Pulse: 450W; Type: Zener; Unidirectional Channels: 1; Voltage - Reverse Standoff (Typ): 36V (Max); Part Number: AQ36-01FTG; Applications: Automotive, CAN; ComponentLink1Description: Datasheet; ComponentLink1URL: https://www.littelfuse.com/~/media/electronics/datasheets/tvs_diode_arrays/littelfuse_tvs_diode_array_aqxx_datasheet.pdf.pdf; ComponentLink2Description: DigiKey Link; ComponentLink2URL: http://digikey.com/product-detail/en/littelfuse-inc/AQ36-01FTG/F10392CT-ND/7902220; LastUpdated: 9/2/2020 1:28:27 AM; Lifecycle Status: Active; Minimum Order: 1; Mounting Type: Surface Mount; Operating Temperature: -40°C ~ 150°C (TA); Package / Case: SC-76, SOD-323; Packaging: TapeAndReel; PartId: 9884; Part Status: Active; Price: 0.11; Series: Automotive, AEC-Q101, AQ, SPA®; Supplier 1: DigiKey; Supplier Part Number 1: F10392CT-ND; Supplier Device Package: SOD-323; Voltage - Clamping (Max) @ Ipp: 62V
footprint SOD323
pins: 1, 2

## AQ36C-01FTG
designator D?